# Altium footprint library sensor_pcblib.PcbLib: 15 footprints
Each footprint in its own frame and in the unit in brackets; x right, y up, seen from the top. Pads: shape width x height; smd on the part's side, far side on the other; paste and mask are expansions set on the pad; w line width, h text height; cw(c..) or ccw(c..) is an arc to the next point about the centre after c.
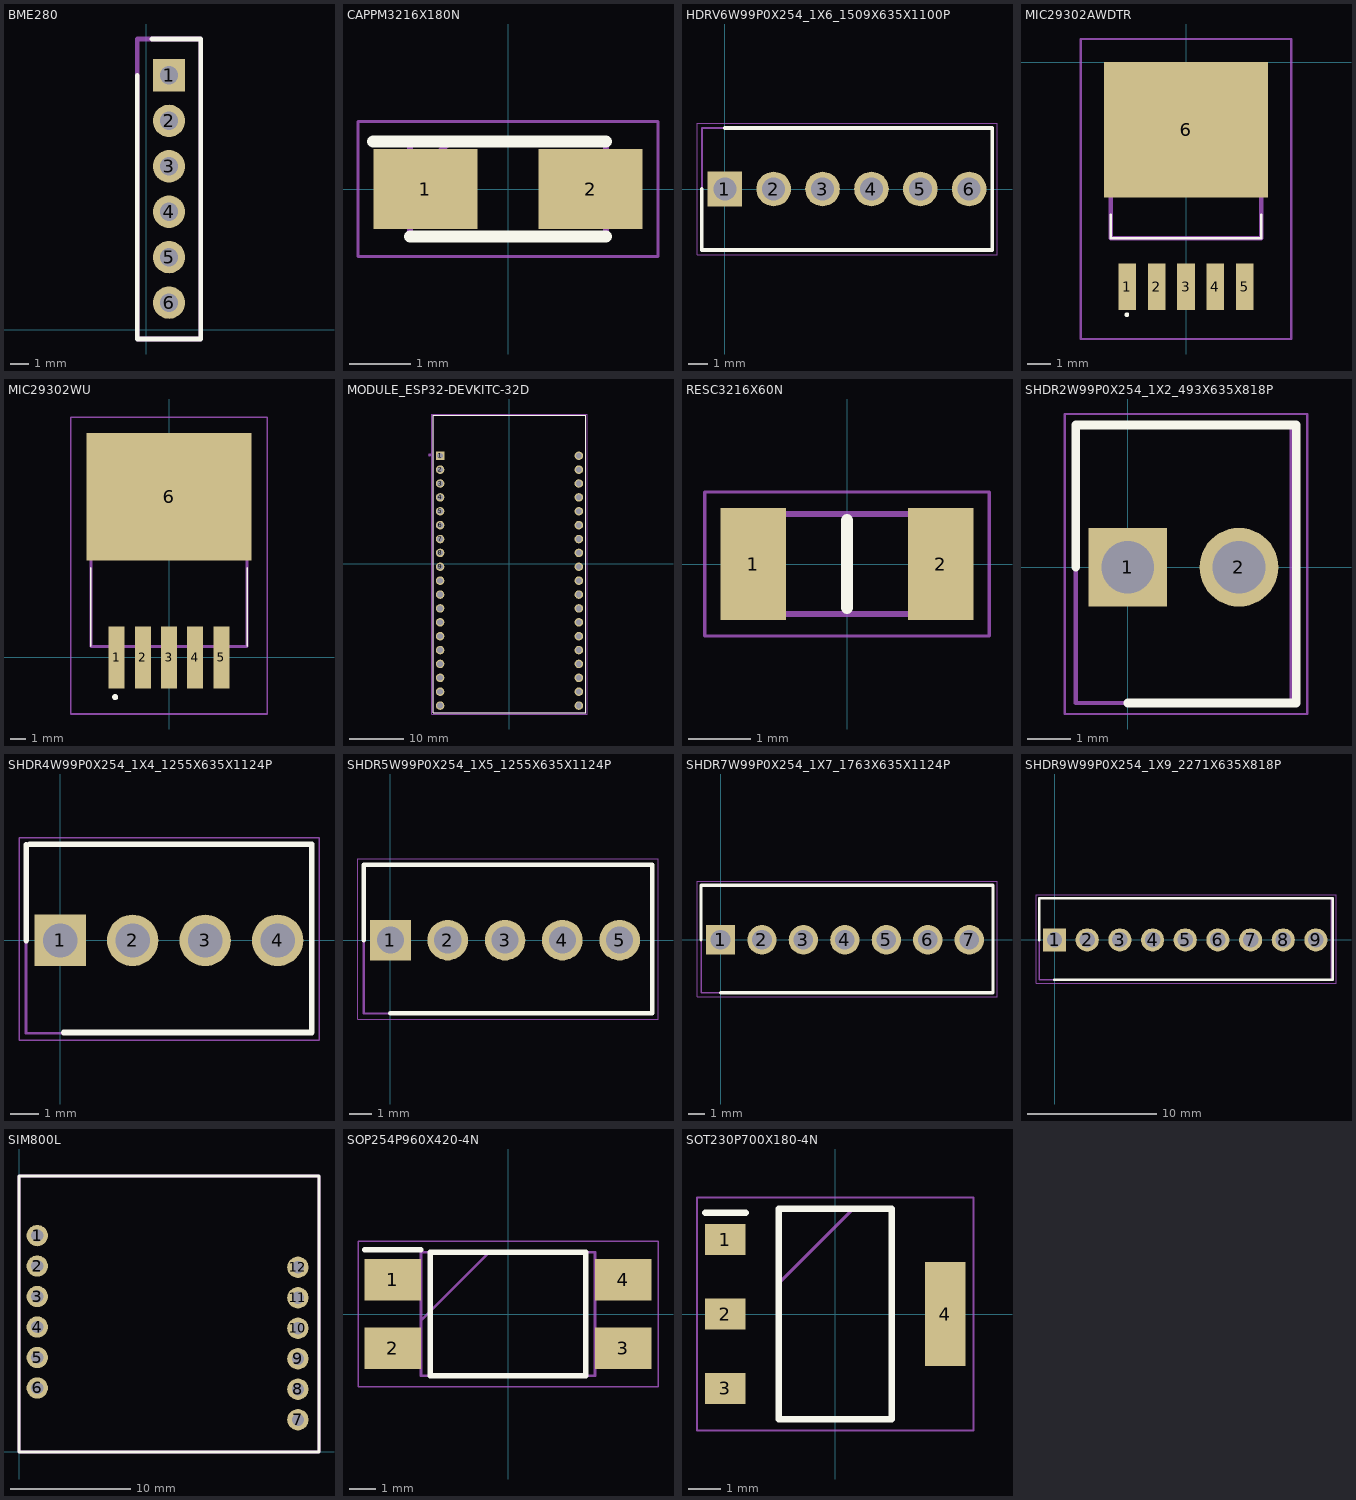
[diagram p0: the footprints below, top view; thin cyan lines are the x and y axes]

## BME280 [mil]
pads (6):
  rect 70x70 hole 40 square: 1(49.21,551.18)
  round 70 hole 40: 2(49.21,452.76) 3(49.21,354.33) 4(49.21,255.91) 5(49.21,157.48) 6(49.21,59.06)
Top Overlay:
  lines w10: -19.68,551.18 -19.68,452.76 -19.68,153.54 -19.68,-19.68 118.11,-19.68 118.11,629.92 11.81,629.92
Mechanical 1:
  lines w10: -19.68,-19.68 -19.68,629.92 118.11,629.92 118.11,-19.68 -19.68,-19.68
3D body "User Library-Module_bme280.STEP": height 218.11, standoff -222.83, extent 0,0 452.76,603.94

## CAPPM3216X180N [mm]
pads (2):
  rect 1.7x1.3 smd: 1(-1.35,0) 2(1.35,0)
Top Overlay:
  lines w0.2: -2.2,0.775 1.6,0.775 ; -1.6,-0.775 1.6,-0.775
Mechanical 13:
  lines w0.1: -1.6,0.125 -0.95,0.775 ; -1.6,-0.775 -1.6,0.775 1.6,0.775 1.6,-0.775 -1.6,-0.775
Mechanical 15:
  lines w0.05: -2.45,-1.1 -2.45,1.1 2.45,1.1 2.45,-1.1 -2.45,-1.1
3D body "TCJA106M025R0150.stp": height 1.8, standoff 0, extent -1.6,-0.775 1.6,0.775

## HDRV6W99P0X254_1X6_1509X635X1100P [mm]
pads (6):
  rect 1.8x1.8 hole 1.2: 1(0,0)
  round 1.8 hole 1.2: 2(2.54,0) 3(5.08,0) 4(7.62,0) 5(10.16,0) 6(12.7,0)
Top Overlay:
  lines w0.2: -1.195,0 -1.195,-3.175 13.895,-3.175 13.895,3.175 0,3.175
Mechanical 13:
  lines w0.1: -1.195,-3.175 13.895,-3.175 13.895,3.175 -1.195,3.175 -1.195,-3.175
Mechanical 15:
  lines w0.05: -1.445,-3.425 14.145,-3.425 14.145,3.425 -1.445,3.425 -1.445,-3.425
3D body "1718560006.stp": height 10.63, standoff -2.32, extent -1.244,-3.175 13.844,3.175

## MIC29302AWDTR [mm]
pads (6):
  rect 0.76x2 smd: 1(-2.54,-9.7) 2(-1.27,-9.7) 3(0,-9.7) 4(1.27,-9.7) 5(2.54,-9.7)
  rect 7.1x5.85 smd: 6(0,-2.925)
Top Overlay:
  lines w0.1: -3.25,-6.58 -3.25,-7.6 3.25,-7.6 3.25,-6.58 ; -2.6,-10.9 ccw(c-2.55,-10.9) -2.5,-10.9 ccw(c-2.55,-10.9) -2.6,-10.9
Mechanical 13:
  lines w0.2: -3.25,-7.6 -3.25,-1.5 3.25,-1.5 3.25,-7.6 -3.25,-7.6
Mechanical 15:
  lines w0.1: -4.55,-11.95 -4.55,1 4.55,1 4.55,-11.95 -4.55,-11.95

## MIC29302WU [mm]
pads (6):
  rect 1.041x4.039 smd: 1(-3.404,0) 2(-1.702,0) 3(0,0) 4(1.702,0) 5(3.404,0)
  rect 10.744x8.306 smd: 6(0,10.452)
Top Overlay:
  lines w0.1: -5.08,0.717 -5.08,5.826 ; 5.08,0.726 5.08,5.826
  lines w0.2: -3.6,-2.574 cw(c-3.5,-2.574) -3.4,-2.574 cw(c-3.5,-2.574) -3.6,-2.574
Mechanical 13:
  lines w0.2: -5.08,0.717 -5.08,9.735 5.08,9.735 5.08,0.717 -5.08,0.717
Mechanical 15:
  lines w0.1: -6.372,-3.674 -6.372,15.605 6.372,15.605 6.372,-3.674 -6.372,-3.674
3D body "MIC29302WU.stp": height 5.18, standoff 0, extent -5.08,0.104 5.08,9.735

## MODULE_ESP32-DEVKITC-32D [mm]
pads (38):
  rect 1.56x1.56 hole 1.04: 1(-12.7,19.76)
  round 1.56 hole 1.04: 2(-12.7,17.22) 3(-12.7,14.68) 4(-12.7,12.14) 5(-12.7,9.6) 6(-12.7,7.06) 7(-12.7,4.52) 8(-12.7,1.98) 9(-12.7,-0.56) 10(-12.7,-3.1) 11(-12.7,-5.64) 12(-12.7,-8.18) 13(-12.7,-10.72) 14(-12.7,-13.26) 15(-12.7,-15.8) 16(-12.7,-18.34) 17(-12.7,-20.88) 18(-12.7,-23.42) 19(-12.7,-25.96) 20(12.7,19.76) 21(12.7,17.22) 22(12.7,14.68) 23(12.7,12.14) 24(12.7,9.6) 25(12.7,7.06) 26(12.7,4.52) 27(12.7,1.98) 28(12.7,-0.56) 29(12.7,-3.1) 30(12.7,-5.64) 31(12.7,-8.18) 32(12.7,-10.72) 33(12.7,-13.26) 34(12.7,-15.8) 35(12.7,-18.34) 36(12.7,-20.88) 37(12.7,-23.42) 38(12.7,-25.96)
Top Overlay:
  lines w0.127: -13.95,-27.25 -13.95,27.15 13.95,27.15 13.95,-27.25 -13.95,-27.25
Mechanical 13:
  circle w0.28: c-14.6,19.9 r0.14
  lines w0.127: -13.95,-27.25 13.95,-27.25 13.95,27.15 -13.95,27.15 -13.95,-27.25
Mechanical 15:
  lines w0.05: -14.2,-27.5 14.2,-27.5 14.2,27.4 -14.2,27.4 -14.2,-27.5
3D body "step_temp.STEP": height 6.7, standoff -5.99, extent -14.097,-27.931 13.843,27.169

## RESC3216X60N [mm]
pads (2):
  rect 1.05x1.8 smd: 1(-1.5,0) 2(1.5,0)
Top Overlay:
  lines w0.2: 0,-0.7 0,0.7
Mechanical 13:
  lines w0.1: -1.575,-0.8 -1.575,0.8 1.575,0.8 1.575,-0.8 -1.575,-0.8
Mechanical 15:
  lines w0.05: -2.275,-1.15 -2.275,1.15 2.275,1.15 2.275,-1.15 -2.275,-1.15
3D body "CRCW120610K0JNEAC.stp": height 0.6, standoff 0, extent -1.575,-0.8 1.575,0.8

## SHDR2W99P0X254_1X2_493X635X818P [mm]
pads (2):
  rect 1.8x1.8 hole 1.2: 1(0,0)
  round 1.8 hole 1.2: 2(2.54,0)
Top Overlay:
  lines w0.2: -1.19,0 -1.19,3.25 3.85,3.25 3.85,-3.1 0,-3.1
Mechanical 13:
  lines w0.1: -1.19,-3.1 3.74,-3.1 3.74,3.25 -1.19,3.25 -1.19,-3.1
Mechanical 15:
  lines w0.05: -1.44,-3.35 4.1,-3.35 4.1,3.5 -1.44,3.5 -1.44,-3.35
3D body "1718560002.stp": height 10.63, standoff -2.32, extent -1.164,-3.075 3.764,3.275

## SHDR4W99P0X254_1X4_1255X635X1124P [mm]
pads (4):
  rect 1.8x1.8 hole 1.2: 1(0,0)
  round 1.8 hole 1.2: 2(2.54,0) 3(5.08,0) 4(7.62,0)
Top Overlay:
  lines w0.2: -1.19,0 -1.19,3.35 ; -1.063,3.372 8.816,3.372 8.816,1.722 8.816,-3.228 0.127,-3.228
Mechanical 13:
  lines w0.1: -1.19,-3.25 -1.19,3.35 8.763,3.35 8.763,-3.25 -1.19,-3.25
Mechanical 15:
  lines w0.05: 9.066,-1.905 9.066,3.6 -1.44,3.6 -1.44,-3.5 9.066,-3.5 9.066,-1.725
3D body "1718560004.stp": height 10.63, standoff -2.32, extent -1.194,-3.175 8.814,3.175

## SHDR5W99P0X254_1X5_1255X635X1124P [mm]
pads (5):
  rect 1.8x1.8 hole 1.2: 1(0,0)
  round 1.8 hole 1.2: 2(2.54,0) 3(5.08,0) 4(7.62,0) 5(10.16,0)
Top Overlay:
  lines w0.2: -1.19,0 -1.19,3.35 11.61,3.35 11.61,-3.25 0,-3.25
Mechanical 13:
  lines w0.1: -1.19,-3.25 11.61,-3.25 11.61,3.35 -1.19,3.35 -1.19,-3.25
Mechanical 15:
  lines w0.05: -1.44,-3.5 11.86,-3.5 11.86,3.6 -1.44,3.6 -1.44,-3.5
3D body "171856-0005.stp": height 11.24, standoff -2.59, extent -1.195,-3.175 11.355,3.175

## SHDR7W99P0X254_1X7_1763X635X1124P [mm]
pads (7):
  rect 1.8x1.8 hole 1.2: 1(0,0)
  round 1.8 hole 1.2: 2(2.54,0) 3(5.08,0) 4(7.62,0) 5(10.16,0) 6(12.7,0) 7(15.24,0)
Top Overlay:
  lines w0.2: -1.19,0 -1.19,3.35 16.69,3.35 16.69,-3.25 0,-3.25
Mechanical 13:
  lines w0.1: -1.19,-3.25 -1.19,3.35 16.69,3.35 16.69,-3.25 -1.19,-3.25
Mechanical 15:
  lines w0.05: -1.44,-3.5 -1.44,3.6 16.94,3.6 16.94,-3.5 -1.44,-3.5
3D body "171856-0007.stp": height 11.24, standoff -2.59, extent -1.195,-3.175 16.435,3.175

## SHDR9W99P0X254_1X9_2271X635X818P [mm]
pads (9):
  rect 1.8x1.8 hole 1.2: 1(0,0)
  round 1.8 hole 1.2: 2(2.54,0) 3(5.08,0) 4(7.62,0) 5(10.16,0) 6(12.7,0) 7(15.24,0) 8(17.78,0) 9(20.32,0)
Top Overlay:
  lines w0.2: -1.19,0 -1.19,3.25 21.63,3.25 21.63,-3.1 0,-3.1
Mechanical 13:
  lines w0.1: -1.19,-3.1 21.52,-3.1 21.52,3.25 -1.19,3.25 -1.19,-3.1
Mechanical 15:
  lines w0.05: -1.44,-3.35 21.88,-3.35 21.88,3.5 -1.44,3.5 -1.44,-3.35
3D body "1718560009.stp": height 10.63, standoff -2.32, extent -1.154,-3.15 21.554,3.2

## SIM800L [mil]
pads (12):
  round 70 hole 40: 1(60,710) 2(60,610) 3(60,510) 4(60,410) 5(60,310) 6(60,210) 7(915,105.94) 8(915,205.94) 9(915,305.94) 10(915,405.94) 11(915,505.94) 12(915,605.94)
Top Overlay:
  lines w10: 0,0 0,905.51 984.25,905.51 984.25,0 0,0
Mechanical 1:
  lines w10: 0,0 984.25,0 984.25,905.51 0,905.51 0,0
3D body "User Library-module_sim800l.STEP": height 269.24, standoff -222.83, extent 0,0 984.25,910.78

## SOP254P960X420-4N [mm]
pads (4):
  rect 2.1x1.55 smd: 1(-4.3,1.27) 2(-4.3,-1.27) 3(4.3,-1.27) 4(4.3,1.27)
Top Overlay:
  lines w0.2: -5.35,2.395 -3.25,2.395 ; -2.9,-2.3 2.9,-2.3 2.9,2.3 -2.9,2.3 -2.9,-2.3
Mechanical 13:
  lines w0.1: -3.25,-0.24 -0.71,2.3 ; -3.25,-2.3 3.25,-2.3 3.25,2.3 -3.25,2.3 -3.25,-2.3
Mechanical 15:
  lines w0.05: -5.6,-2.725 5.6,-2.725 5.6,2.725 -5.6,2.725 -5.6,-2.725
3D body "PC817X2NIP1B.stp": height 4.2, standoff 0, extent -4.8,-2.3 4.8,2.3

## SOT230P700X180-4N [mm]
pads (4):
  rect 1.25x0.95 smd: 1(-3.4,2.3) 2(-3.4,0) 3(-3.4,-2.3)
  rect 1.25x3.2 smd: 4(3.4,0)
Top Overlay:
  lines w0.2: -4.025,3.125 -2.775,3.125 ; -1.75,-3.25 1.75,-3.25 1.75,3.25 -1.75,3.25 -1.75,-3.25
Mechanical 13:
  lines w0.1: -1.75,0.95 0.55,3.25 ; -1.75,-3.25 1.75,-3.25 1.75,3.25 -1.75,3.25 -1.75,-3.25
Mechanical 15:
  lines w0.05: -4.275,-3.6 4.275,-3.6 4.275,3.6 -4.275,3.6 -4.275,-3.6
3D body "NCP1117ST33T3G.stp": height 1.8, standoff 0, extent -3.5,-3.25 3.5,3.25